# Altium schematic symbol library jlcpcb_2025_04_capacitors_extended_0603.schlib: 3668 symbols (part 11 of 20) (continued)
## CC0603MRX7R7BB104
designator C?  Capacitance: 100nF  (hidden comment: *)
Capacitor, Ceramic (MLCC), 100nF, ±20%, 16V, X7R, ±20%, SMD 0603; Manufacturer: YAGEO; Manufacturer Part Number: CC0603MRX7R7BB104; Package Size: 0603; JLCPCB Basic Part: No; JLCPCB Part Number: C2172848; Supplier 1: LCSC; Category: Capacitors - MLCC; Supplier Part Number 1: C2172848; Tolerance: ±20%; Voltage Rating: 16V; Temperature Coefficient: X7R; RoHS: Yes; ComponentLink1Description: Datasheet; ComponentLink1URL: https://wmsc.lcsc.com/wmsc/upload/file/pdf/v2/lcsc/2202040600_YAGEO-CC0603MRX7R7BB104_C2172848.pdf; ComponentLink2Description: JLCPCB Part URL; ComponentLink2URL: https://jlcpcb.com/partdetail/C2172848; ComponentLink3Description: LCSC Part URL; ComponentLink3URL: https://lcsc.com/product-detail/Multilayer-Ceramic-Capacitors-MLCC---SMD-SMT_YAGEO-YAGEO-CC0603MRX7R7BB104_C2172848.html
footprint CAP-0603 (0603 (1608M) Capacitor)
pins: 1, 2

## CC0603MRX7R8BB103
designator C?  Capacitance: 10nF  (hidden comment: *)
Capacitor, Ceramic (MLCC), 10nF, ±20%, 25V, X7R, ±20%, SMD 0603; Manufacturer: YAGEO; Manufacturer Part Number: CC0603MRX7R8BB103; Package Size: 0603; JLCPCB Basic Part: No; JLCPCB Part Number: C2181195; Supplier 1: LCSC; Category: Capacitors - MLCC; Supplier Part Number 1: C2181195; Tolerance: ±20%; Voltage Rating: 25V; Temperature Coefficient: X7R; RoHS: Yes; ComponentLink1Description: Datasheet; ComponentLink1URL: https://wmsc.lcsc.com/wmsc/upload/file/pdf/v2/lcsc/2202041200_YAGEO-CC0603MRX7R8BB103_C2181195.pdf; ComponentLink2Description: JLCPCB Part URL; ComponentLink2URL: https://jlcpcb.com/partdetail/C2181195; ComponentLink3Description: LCSC Part URL; ComponentLink3URL: https://lcsc.com/product-detail/Multilayer-Ceramic-Capacitors-MLCC---SMD-SMT_YAGEO-YAGEO-CC0603MRX7R8BB103_C2181195.html
footprint CAP-0603 (0603 (1608M) Capacitor)
pins: 1, 2

## CC0603MRX7R8BB104
designator C?  Capacitance: 100nF  (hidden comment: *)
Capacitor, Ceramic (MLCC), 100nF, ±20%, 25V, X7R, ±20%, SMD 0603; Manufacturer: YAGEO; Manufacturer Part Number: CC0603MRX7R8BB104; Package Size: 0603; JLCPCB Basic Part: No; JLCPCB Part Number: C2168700; Supplier 1: LCSC; Category: Capacitors - MLCC; Supplier Part Number 1: C2168700; Tolerance: ±20%; Voltage Rating: 25V; Temperature Coefficient: X7R; RoHS: Yes; ComponentLink1Description: Datasheet; ComponentLink1URL: https://wmsc.lcsc.com/wmsc/upload/file/pdf/v2/lcsc/2202040300_YAGEO-CC0603MRX7R8BB104_C2168700.pdf; ComponentLink2Description: JLCPCB Part URL; ComponentLink2URL: https://jlcpcb.com/partdetail/C2168700; ComponentLink3Description: LCSC Part URL; ComponentLink3URL: https://lcsc.com/product-detail/Multilayer-Ceramic-Capacitors-MLCC---SMD-SMT_YAGEO-YAGEO-CC0603MRX7R8BB104_C2168700.html
footprint CAP-0603 (0603 (1608M) Capacitor)
pins: 1, 2

## CC0603MRX7R8BB223
designator C?  Capacitance: 22nF  (hidden comment: *)
Capacitor, Ceramic (MLCC), 22nF, ±20%, 25V, X7R, ±20%, SMD 0603; Manufacturer: YAGEO; Manufacturer Part Number: CC0603MRX7R8BB223; Package Size: 0603; JLCPCB Basic Part: No; JLCPCB Part Number: C596326; Supplier 1: LCSC; Category: Capacitors - MLCC; Supplier Part Number 1: C596326; Tolerance: ±20%; Voltage Rating: 25V; Temperature Coefficient: X7R; RoHS: Yes; ComponentLink1Description: Datasheet; ComponentLink1URL: https://wmsc.lcsc.com/wmsc/upload/file/pdf/v2/lcsc/2006091816_YAGEO-CC0603MRX7R8BB223_C596326.pdf; ComponentLink2Description: JLCPCB Part URL; ComponentLink2URL: https://jlcpcb.com/partdetail/C596326; ComponentLink3Description: LCSC Part URL; ComponentLink3URL: https://lcsc.com/product-detail/Multilayer-Ceramic-Capacitors-MLCC---SMD-SMT_YAGEO-YAGEO-CC0603MRX7R8BB223_C596326.html
footprint CAP-0603 (0603 (1608M) Capacitor)
pins: 1, 2

## CC0603MRX7R9BB101
designator C?  Capacitance: 100pF  (hidden comment: *)
Capacitor, Ceramic (MLCC), 100pF, ±20%, 50V, X7R, ±20%, SMD 0603; Manufacturer: YAGEO; Manufacturer Part Number: CC0603MRX7R9BB101; Package Size: 0603; JLCPCB Basic Part: No; JLCPCB Part Number: C2185110; Supplier 1: LCSC; Category: Capacitors - MLCC; Supplier Part Number 1: C2185110; Tolerance: ±20%; Voltage Rating: 50V; Temperature Coefficient: X7R; RoHS: Yes; ComponentLink1Description: Datasheet; ComponentLink1URL: https://wmsc.lcsc.com/wmsc/upload/file/pdf/v2/lcsc/2202041500_YAGEO-CC0603MRX7R9BB101_C2185110.pdf; ComponentLink2Description: JLCPCB Part URL; ComponentLink2URL: https://jlcpcb.com/partdetail/C2185110; ComponentLink3Description: LCSC Part URL; ComponentLink3URL: https://lcsc.com/product-detail/Multilayer-Ceramic-Capacitors-MLCC---SMD-SMT_YAGEO-YAGEO-CC0603MRX7R9BB101_C2185110.html
footprint CAP-0603 (0603 (1608M) Capacitor)
pins: 1, 2

## CC0603MRX7R9BB103
designator C?  Capacitance: 10nF  (hidden comment: *)
Capacitor, Ceramic (MLCC), 10nF, ±20%, 50V, X7R, ±20%, SMD 0603; Manufacturer: YAGEO; Manufacturer Part Number: CC0603MRX7R9BB103; Package Size: 0603; JLCPCB Basic Part: No; JLCPCB Part Number: C726619; Supplier 1: LCSC; Category: Capacitors - MLCC; Supplier Part Number 1: C726619; Tolerance: ±20%; Voltage Rating: 50V; Temperature Coefficient: X7R; RoHS: Yes; ComponentLink1Description: Datasheet; ComponentLink1URL: https://wmsc.lcsc.com/wmsc/upload/file/pdf/v2/lcsc/2203311630_YAGEO-CC0603MRX7R9BB103_C726619.pdf; ComponentLink2Description: JLCPCB Part URL; ComponentLink2URL: https://jlcpcb.com/partdetail/C726619; ComponentLink3Description: LCSC Part URL; ComponentLink3URL: https://lcsc.com/product-detail/Multilayer-Ceramic-Capacitors-MLCC---SMD-SMT_YAGEO-YAGEO-CC0603MRX7R9BB103_C726619.html
footprint CAP-0603 (0603 (1608M) Capacitor)
pins: 1, 2

## CC0603MRX7R9BB104
designator C?  Capacitance: 100nF  (hidden comment: *)
Capacitor, Ceramic (MLCC), 100nF, ±20%, 50V, X7R, ±20%, SMD 0603; Manufacturer: YAGEO; Manufacturer Part Number: CC0603MRX7R9BB104; Package Size: 0603; JLCPCB Basic Part: No; JLCPCB Part Number: C2175984; Supplier 1: LCSC; Category: Capacitors - MLCC; Supplier Part Number 1: C2175984; Tolerance: ±20%; Voltage Rating: 50V; Temperature Coefficient: X7R; RoHS: Yes; ComponentLink1Description: Datasheet; ComponentLink1URL: https://wmsc.lcsc.com/wmsc/upload/file/pdf/v2/lcsc/2202040800_YAGEO-CC0603MRX7R9BB104_C2175984.pdf; ComponentLink2Description: JLCPCB Part URL; ComponentLink2URL: https://jlcpcb.com/partdetail/C2175984; ComponentLink3Description: LCSC Part URL; ComponentLink3URL: https://lcsc.com/product-detail/Multilayer-Ceramic-Capacitors-MLCC---SMD-SMT_YAGEO-YAGEO-CC0603MRX7R9BB104_C2175984.html
footprint CAP-0603 (0603 (1608M) Capacitor)
pins: 1, 2

## CC0603MRX7R9BB222
designator C?  Capacitance: 2.2nF  (hidden comment: *)
Capacitor, Ceramic (MLCC), 2.2nF, ±20%, 50V, X7R, ±20%, SMD 0603; Manufacturer: YAGEO; Manufacturer Part Number: CC0603MRX7R9BB222; Package Size: 0603; JLCPCB Basic Part: No; JLCPCB Part Number: C2185433; Supplier 1: LCSC; Category: Capacitors - MLCC; Supplier Part Number 1: C2185433; Tolerance: ±20%; Voltage Rating: 50V; Temperature Coefficient: X7R; RoHS: Yes; ComponentLink1Description: Datasheet; ComponentLink1URL: https://wmsc.lcsc.com/wmsc/upload/file/pdf/v2/lcsc/2202041500_YAGEO-CC0603MRX7R9BB222_C2185433.pdf; ComponentLink2Description: JLCPCB Part URL; ComponentLink2URL: https://jlcpcb.com/partdetail/C2185433; ComponentLink3Description: LCSC Part URL; ComponentLink3URL: https://lcsc.com/product-detail/Multilayer-Ceramic-Capacitors-MLCC---SMD-SMT_YAGEO-YAGEO-CC0603MRX7R9BB222_C2185433.html
footprint CAP-0603 (0603 (1608M) Capacitor)
pins: 1, 2

## CC0603MRX7R9BB223
designator C?  Capacitance: 22nF  (hidden comment: *)
Capacitor, Ceramic (MLCC), 22nF, ±20%, 50V, X7R, ±20%, SMD 0603; Manufacturer: YAGEO; Manufacturer Part Number: CC0603MRX7R9BB223; Package Size: 0603; JLCPCB Basic Part: No; JLCPCB Part Number: C1852881; Supplier 1: LCSC; Category: Capacitors - MLCC; Supplier Part Number 1: C1852881; Tolerance: ±20%; Voltage Rating: 50V; Temperature Coefficient: X7R; RoHS: Yes; ComponentLink1Description: Datasheet; ComponentLink1URL: https://wmsc.lcsc.com/wmsc/upload/file/pdf/v2/lcsc/2202081930_YAGEO-CC0603MRX7R9BB223_C1852881.pdf; ComponentLink2Description: JLCPCB Part URL; ComponentLink2URL: https://jlcpcb.com/partdetail/C1852881; ComponentLink3Description: LCSC Part URL; ComponentLink3URL: https://lcsc.com/product-detail/Multilayer-Ceramic-Capacitors-MLCC---SMD-SMT_YAGEO-YAGEO-CC0603MRX7R9BB223_C1852881.html
footprint CAP-0603 (0603 (1608M) Capacitor)
pins: 1, 2

## CC0603MRX7R9BB332
designator C?  Capacitance: 3.3nF  (hidden comment: *)
Capacitor, Ceramic (MLCC), 3.3nF, ±20%, 50V, X7R, ±20%, SMD 0603; Manufacturer: YAGEO; Manufacturer Part Number: CC0603MRX7R9BB332; Package Size: 0603; JLCPCB Basic Part: No; JLCPCB Part Number: C2180592; Supplier 1: LCSC; Category: Capacitors - MLCC; Supplier Part Number 1: C2180592; Tolerance: ±20%; Voltage Rating: 50V; Temperature Coefficient: X7R; RoHS: Yes; ComponentLink1Description: Datasheet; ComponentLink1URL: https://wmsc.lcsc.com/wmsc/upload/file/pdf/v2/lcsc/2202041130_YAGEO-CC0603MRX7R9BB332_C2180592.pdf; ComponentLink2Description: JLCPCB Part URL; ComponentLink2URL: https://jlcpcb.com/partdetail/C2180592; ComponentLink3Description: LCSC Part URL; ComponentLink3URL: https://lcsc.com/product-detail/Multilayer-Ceramic-Capacitors-MLCC---SMD-SMT_YAGEO-YAGEO-CC0603MRX7R9BB332_C2180592.html
footprint CAP-0603 (0603 (1608M) Capacitor)
pins: 1, 2

## CC0603MRX7R9BB471
designator C?  Capacitance: 470pF  (hidden comment: *)
Capacitor, Ceramic (MLCC), 470pF, ±20%, 50V, X7R, ±20%, SMD 0603; Manufacturer: YAGEO; Manufacturer Part Number: CC0603MRX7R9BB471; Package Size: 0603; JLCPCB Basic Part: No; JLCPCB Part Number: C2172850; Supplier 1: LCSC; Category: Capacitors - MLCC; Supplier Part Number 1: C2172850; Tolerance: ±20%; Voltage Rating: 50V; Temperature Coefficient: X7R; RoHS: Yes; ComponentLink1Description: Datasheet; ComponentLink1URL: https://wmsc.lcsc.com/wmsc/upload/file/pdf/v2/lcsc/2202040600_YAGEO-CC0603MRX7R9BB471_C2172850.pdf; ComponentLink2Description: JLCPCB Part URL; ComponentLink2URL: https://jlcpcb.com/partdetail/C2172850; ComponentLink3Description: LCSC Part URL; ComponentLink3URL: https://lcsc.com/product-detail/Multilayer-Ceramic-Capacitors-MLCC---SMD-SMT_YAGEO-YAGEO-CC0603MRX7R9BB471_C2172850.html
footprint CAP-0603 (0603 (1608M) Capacitor)
pins: 1, 2

## CC0603MRX7R9BB472
designator C?  Capacitance: 4.7nF  (hidden comment: *)
Capacitor, Ceramic (MLCC), 4.7nF, ±20%, 50V, X7R, ±20%, SMD 0603; Manufacturer: YAGEO; Manufacturer Part Number: CC0603MRX7R9BB472; Package Size: 0603; JLCPCB Basic Part: No; JLCPCB Part Number: C2180681; Supplier 1: LCSC; Category: Capacitors - MLCC; Supplier Part Number 1: C2180681; Tolerance: ±20%; Voltage Rating: 50V; Temperature Coefficient: X7R; RoHS: Yes; ComponentLink1Description: Datasheet; ComponentLink1URL: https://wmsc.lcsc.com/wmsc/upload/file/pdf/v2/lcsc/2202041130_YAGEO-CC0603MRX7R9BB472_C2180681.pdf; ComponentLink2Description: JLCPCB Part URL; ComponentLink2URL: https://jlcpcb.com/partdetail/C2180681; ComponentLink3Description: LCSC Part URL; ComponentLink3URL: https://lcsc.com/product-detail/Multilayer-Ceramic-Capacitors-MLCC---SMD-SMT_YAGEO-YAGEO-CC0603MRX7R9BB472_C2180681.html
footprint CAP-0603 (0603 (1608M) Capacitor)
pins: 1, 2

## CC0603MRX7R9BB682
designator C?  Capacitance: 6.8nF  (hidden comment: *)
Capacitor, Ceramic (MLCC), 6.8nF, ±20%, 50V, X7R, ±20%, SMD 0603; Manufacturer: YAGEO; Manufacturer Part Number: CC0603MRX7R9BB682; Package Size: 0603; JLCPCB Basic Part: No; JLCPCB Part Number: C1853064; Supplier 1: LCSC; Category: Capacitors - MLCC; Supplier Part Number 1: C1853064; Tolerance: ±20%; Voltage Rating: 50V; Temperature Coefficient: X7R; RoHS: Yes; ComponentLink1Description: Datasheet; ComponentLink1URL: https://wmsc.lcsc.com/wmsc/upload/file/pdf/v2/lcsc/2201271030_YAGEO-CC0603MRX7R9BB682_C1853064.pdf; ComponentLink2Description: JLCPCB Part URL; ComponentLink2URL: https://jlcpcb.com/partdetail/C1853064; ComponentLink3Description: LCSC Part URL; ComponentLink3URL: https://lcsc.com/product-detail/Multilayer-Ceramic-Capacitors-MLCC---SMD-SMT_YAGEO-YAGEO-CC0603MRX7R9BB682_C1853064.html
footprint CAP-0603 (0603 (1608M) Capacitor)
pins: 1, 2

## CC0603MRY5V6BB105
designator C?  Capacitance: 1uF  (hidden comment: *)
Capacitor, Ceramic (MLCC), 1uF, ±20%, 10V, Y5V, ±20%, SMD 0603; Manufacturer: YAGEO; Manufacturer Part Number: CC0603MRY5V6BB105; Package Size: 0603; JLCPCB Basic Part: No; JLCPCB Part Number: C519503; Supplier 1: LCSC; Category: Capacitors - MLCC; Supplier Part Number 1: C519503; Tolerance: ±20%; Voltage Rating: 10V; Temperature Coefficient: Y5V; RoHS: Yes; ComponentLink1Description: Datasheet; ComponentLink1URL: https://wmsc.lcsc.com/wmsc/upload/file/pdf/v2/lcsc/2006011835_YAGEO-CC0603MRY5V6BB105_C519503.pdf; ComponentLink2Description: JLCPCB Part URL; ComponentLink2URL: https://jlcpcb.com/partdetail/C519503; ComponentLink3Description: LCSC Part URL; ComponentLink3URL: https://lcsc.com/product-detail/Multilayer-Ceramic-Capacitors-MLCC---SMD-SMT_YAGEO-YAGEO-CC0603MRY5V6BB105_C519503.html
footprint CAP-0603 (0603 (1608M) Capacitor)
pins: 1, 2

## CC0603MRY5V6BB225
designator C?  Capacitance: 2.2uF  (hidden comment: *)
Capacitor, Ceramic (MLCC), 2.2uF, ±20%, 10V, Y5V, ±20%, SMD 0603; Manufacturer: YAGEO; Manufacturer Part Number: CC0603MRY5V6BB225; Package Size: 0603; JLCPCB Basic Part: No; JLCPCB Part Number: C519505; Supplier 1: LCSC; Category: Capacitors - MLCC; Supplier Part Number 1: C519505; Tolerance: ±20%; Voltage Rating: 10V; Temperature Coefficient: Y5V; RoHS: Yes; ComponentLink1Description: Datasheet; ComponentLink1URL: https://wmsc.lcsc.com/wmsc/upload/file/pdf/v2/lcsc/2010251434_YAGEO-CC0603MRY5V6BB225_C519505.pdf; ComponentLink2Description: JLCPCB Part URL; ComponentLink2URL: https://jlcpcb.com/partdetail/C519505; ComponentLink3Description: LCSC Part URL; ComponentLink3URL: https://lcsc.com/product-detail/Multilayer-Ceramic-Capacitors-MLCC---SMD-SMT_YAGEO-YAGEO-CC0603MRY5V6BB225_C519505.html
footprint CAP-0603 (0603 (1608M) Capacitor)
pins: 1, 2

## CC0603MRY5V7BB104
designator C?  Capacitance: 100nF  (hidden comment: *)
Capacitor, Ceramic (MLCC), 100nF, ±20%, 16V, Y5V, ±20%, SMD 0603; Manufacturer: YAGEO; Manufacturer Part Number: CC0603MRY5V7BB104; Package Size: 0603; JLCPCB Basic Part: No; JLCPCB Part Number: C519501; Supplier 1: LCSC; Category: Capacitors - MLCC; Supplier Part Number 1: C519501; Tolerance: ±20%; Voltage Rating: 16V; Temperature Coefficient: Y5V; RoHS: Yes; ComponentLink1Description: Datasheet; ComponentLink1URL: https://wmsc.lcsc.com/wmsc/upload/file/pdf/v2/lcsc/2210272130_YAGEO-CC0603MRY5V7BB104_C519501.pdf; ComponentLink2Description: JLCPCB Part URL; ComponentLink2URL: https://jlcpcb.com/partdetail/C519501; ComponentLink3Description: LCSC Part URL; ComponentLink3URL: https://lcsc.com/product-detail/Multilayer-Ceramic-Capacitors-MLCC---SMD-SMT_YAGEO-YAGEO-CC0603MRY5V7BB104_C519501.html
footprint CAP-0603 (0603 (1608M) Capacitor)
pins: 1, 2

## CC0603MRY5V7BB105
designator C?  Capacitance: 1uF  (hidden comment: *)
Capacitor, Ceramic (MLCC), 1uF, ±20%, 16V, Y5V, ±20%, SMD 0603; Manufacturer: YAGEO; Manufacturer Part Number: CC0603MRY5V7BB105; Package Size: 0603; JLCPCB Basic Part: No; JLCPCB Part Number: C519504; Supplier 1: LCSC; Category: Capacitors - MLCC; Supplier Part Number 1: C519504; Tolerance: ±20%; Voltage Rating: 16V; Temperature Coefficient: Y5V; RoHS: Yes; ComponentLink1Description: Datasheet; ComponentLink1URL: https://wmsc.lcsc.com/wmsc/upload/file/pdf/v2/lcsc/2005181835_YAGEO-CC0603MRY5V7BB105_C519504.pdf; ComponentLink2Description: JLCPCB Part URL; ComponentLink2URL: https://jlcpcb.com/partdetail/C519504; ComponentLink3Description: LCSC Part URL; ComponentLink3URL: https://lcsc.com/product-detail/Multilayer-Ceramic-Capacitors-MLCC---SMD-SMT_YAGEO-YAGEO-CC0603MRY5V7BB105_C519504.html
footprint CAP-0603 (0603 (1608M) Capacitor)
pins: 1, 2

## CC0603MRY5V7BB225
designator C?  Capacitance: 2.2uF  (hidden comment: *)
Capacitor, Ceramic (MLCC), 2.2uF, ±20%, 16V, Y5V, ±20%, SMD 0603; Manufacturer: YAGEO; Manufacturer Part Number: CC0603MRY5V7BB225; Package Size: 0603; JLCPCB Basic Part: No; JLCPCB Part Number: C519506; Supplier 1: LCSC; Category: Capacitors - MLCC; Supplier Part Number 1: C519506; Tolerance: ±20%; Voltage Rating: 16V; Temperature Coefficient: Y5V; RoHS: Yes; ComponentLink1Description: Datasheet; ComponentLink1URL: https://wmsc.lcsc.com/wmsc/upload/file/pdf/v2/lcsc/2006011835_YAGEO-CC0603MRY5V7BB225_C519506.pdf; ComponentLink2Description: JLCPCB Part URL; ComponentLink2URL: https://jlcpcb.com/partdetail/C519506; ComponentLink3Description: LCSC Part URL; ComponentLink3URL: https://lcsc.com/product-detail/Multilayer-Ceramic-Capacitors-MLCC---SMD-SMT_YAGEO-YAGEO-CC0603MRY5V7BB225_C519506.html
footprint CAP-0603 (0603 (1608M) Capacitor)
pins: 1, 2

## CC0603MRY5V7BB474
designator C?  Capacitance: 470nF  (hidden comment: *)
Capacitor, Ceramic (MLCC), 470nF, ±20%, 16V, Y5V, ±20%, SMD 0603; Manufacturer: YAGEO; Manufacturer Part Number: CC0603MRY5V7BB474; Package Size: 0603; JLCPCB Basic Part: No; JLCPCB Part Number: C726620; Supplier 1: LCSC; Category: Capacitors - MLCC; Supplier Part Number 1: C726620; Tolerance: ±20%; Voltage Rating: 16V; Temperature Coefficient: Y5V; RoHS: Yes; ComponentLink1Description: Datasheet; ComponentLink1URL: https://wmsc.lcsc.com/wmsc/upload/file/pdf/v2/lcsc/2304140030_YAGEO-CC0603MRY5V7BB474_C726620.pdf; ComponentLink2Description: JLCPCB Part URL; ComponentLink2URL: https://jlcpcb.com/partdetail/C726620; ComponentLink3Description: LCSC Part URL; ComponentLink3URL: https://lcsc.com/product-detail/Multilayer-Ceramic-Capacitors-MLCC---SMD-SMT_YAGEO-YAGEO-CC0603MRY5V7BB474_C726620.html
footprint CAP-0603 (0603 (1608M) Capacitor)
pins: 1, 2

## CC0603MRY5V8BB104
designator C?  Capacitance: 100nF  (hidden comment: *)
Capacitor, Ceramic (MLCC), 100nF, ±20%, 25V, Y5V, ±20%, SMD 0603; Manufacturer: YAGEO; Manufacturer Part Number: CC0603MRY5V8BB104; Package Size: 0603; JLCPCB Basic Part: No; JLCPCB Part Number: C519502; Supplier 1: LCSC; Category: Capacitors - MLCC; Supplier Part Number 1: C519502; Tolerance: ±20%; Voltage Rating: 25V; Temperature Coefficient: Y5V; RoHS: Yes; ComponentLink1Description: Datasheet; ComponentLink1URL: https://wmsc.lcsc.com/wmsc/upload/file/pdf/v2/lcsc/2205182016_YAGEO-CC0603MRY5V8BB104_C519502.pdf; ComponentLink2Description: JLCPCB Part URL; ComponentLink2URL: https://jlcpcb.com/partdetail/C519502; ComponentLink3Description: LCSC Part URL; ComponentLink3URL: https://lcsc.com/product-detail/Multilayer-Ceramic-Capacitors-MLCC---SMD-SMT_YAGEO-YAGEO-CC0603MRY5V8BB104_C519502.html
footprint CAP-0603 (0603 (1608M) Capacitor)
pins: 1, 2

## CC0603MRY5V9BB104
designator C?  Capacitance: 100nF  (hidden comment: *)
Capacitor, Ceramic (MLCC), 100nF, ±20%, 50V, Y5V, ±20%, SMD 0603; Manufacturer: YAGEO; Manufacturer Part Number: CC0603MRY5V9BB104; Package Size: 0603; JLCPCB Basic Part: No; JLCPCB Part Number: C91184; Supplier 1: LCSC; Category: Capacitors - MLCC; Supplier Part Number 1: C91184; Tolerance: ±20%; Voltage Rating: 50V; Temperature Coefficient: Y5V; RoHS: Yes; ComponentLink1Description: Datasheet; ComponentLink1URL: https://wmsc.lcsc.com/wmsc/upload/file/pdf/v2/lcsc/2304140030_YAGEO-CC0603MRY5V9BB104_C91184.pdf; ComponentLink2Description: JLCPCB Part URL; ComponentLink2URL: https://jlcpcb.com/partdetail/C91184; ComponentLink3Description: LCSC Part URL; ComponentLink3URL: https://lcsc.com/product-detail/Multilayer-Ceramic-Capacitors-MLCC---SMD-SMT_YAGEO-YAGEO-CC0603MRY5V9BB104_C91184.html
footprint CAP-0603 (0603 (1608M) Capacitor)
pins: 1, 2

## CC0603ZRY5V5BB225
designator C?  Capacitance: 2.2uF  (hidden comment: *)
Capacitor, Ceramic (MLCC), 2.2uF, 6.3V, Y5V, SMD 0603; Manufacturer: YAGEO; Manufacturer Part Number: CC0603ZRY5V5BB225; Temperature Rating: -20%~+80%; Package Size: 0603; JLCPCB Basic Part: No; JLCPCB Part Number: C519448; Supplier 1: LCSC; Category: Capacitors - MLCC; Supplier Part Number 1: C519448; Voltage Rating: 6.3V; Temperature Coefficient: Y5V; RoHS: Yes; ComponentLink1Description: Datasheet; ComponentLink1URL: https://wmsc.lcsc.com/wmsc/upload/file/pdf/v2/lcsc/2304140030_YAGEO-CC0603ZRY5V5BB225_C519448.pdf; ComponentLink2Description: JLCPCB Part URL; ComponentLink2URL: https://jlcpcb.com/partdetail/C519448; ComponentLink3Description: LCSC Part URL; ComponentLink3URL: https://lcsc.com/product-detail/Multilayer-Ceramic-Capacitors-MLCC---SMD-SMT_YAGEO-YAGEO-CC0603ZRY5V5BB225_C519448.html
footprint CAP-0603 (0603 (1608M) Capacitor)
pins: 1, 2

## CC0603ZRY5V5BB475
designator C?  Capacitance: 4.7uF  (hidden comment: *)
Capacitor, Ceramic (MLCC), 4.7uF, 6.3V, Y5V, SMD 0603; Manufacturer: YAGEO; Manufacturer Part Number: CC0603ZRY5V5BB475; Temperature Rating: -20%~+80%; Package Size: 0603; JLCPCB Basic Part: No; JLCPCB Part Number: C326060; Supplier 1: LCSC; Category: Capacitors - MLCC; Supplier Part Number 1: C326060; Voltage Rating: 6.3V; Temperature Coefficient: Y5V; RoHS: Yes; ComponentLink1Description: Datasheet; ComponentLink1URL: https://wmsc.lcsc.com/wmsc/upload/file/pdf/v2/lcsc/1811142132_YAGEO-CC0603ZRY5V5BB475_C326060.pdf; ComponentLink2Description: JLCPCB Part URL; ComponentLink2URL: https://jlcpcb.com/partdetail/C326060; ComponentLink3Description: LCSC Part URL; ComponentLink3URL: https://lcsc.com/product-detail/Multilayer-Ceramic-Capacitors-MLCC---SMD-SMT_YAGEO-YAGEO-CC0603ZRY5V5BB475_C326060.html
footprint CAP-0603 (0603 (1608M) Capacitor)
pins: 1, 2

## CC0603ZRY5V6BB105
designator C?  Capacitance: 1uF  (hidden comment: *)
Capacitor, Ceramic (MLCC), 1uF, 10V, Y5V, SMD 0603; Manufacturer: YAGEO; Manufacturer Part Number: CC0603ZRY5V6BB105; Temperature Rating: -20%~+80%; Package Size: 0603; JLCPCB Basic Part: No; JLCPCB Part Number: C106220; Supplier 1: LCSC; Category: Capacitors - MLCC; Supplier Part Number 1: C106220; Voltage Rating: 10V; Temperature Coefficient: Y5V; RoHS: Yes; ComponentLink1Description: Datasheet; ComponentLink1URL: https://wmsc.lcsc.com/wmsc/upload/file/pdf/v2/lcsc/2304140030_YAGEO-CC0603ZRY5V6BB105_C106220.pdf; ComponentLink2Description: JLCPCB Part URL; ComponentLink2URL: https://jlcpcb.com/partdetail/C106220; ComponentLink3Description: LCSC Part URL; ComponentLink3URL: https://lcsc.com/product-detail/Multilayer-Ceramic-Capacitors-MLCC---SMD-SMT_YAGEO-YAGEO-CC0603ZRY5V6BB105_C106220.html
footprint CAP-0603 (0603 (1608M) Capacitor)
pins: 1, 2

## CC0603ZRY5V6BB225
designator C?  Capacitance: 2.2uF  (hidden comment: *)
Capacitor, Ceramic (MLCC), 2.2uF, 10V, Y5V, SMD 0603; Manufacturer: YAGEO; Manufacturer Part Number: CC0603ZRY5V6BB225; Temperature Rating: -20%~+80%; Package Size: 0603; JLCPCB Basic Part: No; JLCPCB Part Number: C106849; Supplier 1: LCSC; Category: Capacitors - MLCC; Supplier Part Number 1: C106849; Voltage Rating: 10V; Temperature Coefficient: Y5V; RoHS: Yes; ComponentLink1Description: Datasheet; ComponentLink1URL: https://wmsc.lcsc.com/wmsc/upload/file/pdf/v2/lcsc/2304140030_YAGEO-CC0603ZRY5V6BB225_C106849.pdf; ComponentLink2Description: JLCPCB Part URL; ComponentLink2URL: https://jlcpcb.com/partdetail/C106849; ComponentLink3Description: LCSC Part URL; ComponentLink3URL: https://lcsc.com/product-detail/Multilayer-Ceramic-Capacitors-MLCC---SMD-SMT_YAGEO-YAGEO-CC0603ZRY5V6BB225_C106849.html
footprint CAP-0603 (0603 (1608M) Capacitor)
pins: 1, 2

## CC0603ZRY5V6BB474
designator C?  Capacitance: 470nF  (hidden comment: *)
Capacitor, Ceramic (MLCC), 470nF, 10V, Y5V, SMD 0603; Manufacturer: YAGEO; Manufacturer Part Number: CC0603ZRY5V6BB474; Temperature Rating: -20%~+80%; Package Size: 0603; JLCPCB Basic Part: No; JLCPCB Part Number: C327269; Supplier 1: LCSC; Category: Capacitors - MLCC; Supplier Part Number 1: C327269; Voltage Rating: 10V; Temperature Coefficient: Y5V; RoHS: Yes; ComponentLink1Description: Datasheet; ComponentLink1URL: https://wmsc.lcsc.com/wmsc/upload/file/pdf/v2/lcsc/2311211121_YAGEO-CC0603ZRY5V6BB474_C327269.pdf; ComponentLink2Description: JLCPCB Part URL; ComponentLink2URL: https://jlcpcb.com/partdetail/C327269; ComponentLink3Description: LCSC Part URL; ComponentLink3URL: https://lcsc.com/product-detail/Multilayer-Ceramic-Capacitors-MLCC---SMD-SMT_YAGEO-YAGEO-CC0603ZRY5V6BB474_C327269.html
footprint CAP-0603 (0603 (1608M) Capacitor)
pins: 1, 2

## CC0603ZRY5V6BB475
designator C?  Capacitance: 4.7uF  (hidden comment: *)
Capacitor, Ceramic (MLCC), 4.7uF, 10V, Y5V, SMD 0603; Manufacturer: YAGEO; Manufacturer Part Number: CC0603ZRY5V6BB475; Temperature Rating: -20%~+80%; Package Size: 0603; JLCPCB Basic Part: No; JLCPCB Part Number: C576864; Supplier 1: LCSC; Category: Capacitors - MLCC; Supplier Part Number 1: C576864; Voltage Rating: 10V; Temperature Coefficient: Y5V; RoHS: Yes; ComponentLink1Description: Datasheet; ComponentLink1URL: https://wmsc.lcsc.com/wmsc/upload/file/pdf/v2/lcsc/2304140030_YAGEO-CC0603ZRY5V6BB475_C576864.pdf; ComponentLink2Description: JLCPCB Part URL; ComponentLink2URL: https://jlcpcb.com/partdetail/C576864; ComponentLink3Description: LCSC Part URL; ComponentLink3URL: https://lcsc.com/product-detail/Multilayer-Ceramic-Capacitors-MLCC---SMD-SMT_YAGEO-YAGEO-CC0603ZRY5V6BB475_C576864.html
footprint CAP-0603 (0603 (1608M) Capacitor)
pins: 1, 2

## CC0603ZRY5V7BB104
designator C?  Capacitance: 100nF  (hidden comment: *)
Capacitor, Ceramic (MLCC), 100nF, 16V, Y5V, SMD 0603; Manufacturer: YAGEO; Manufacturer Part Number: CC0603ZRY5V7BB104; Temperature Rating: -20%~+80%; Package Size: 0603; JLCPCB Basic Part: No; JLCPCB Part Number: C519445; Supplier 1: LCSC; Category: Capacitors - MLCC; Supplier Part Number 1: C519445; Voltage Rating: 16V; Temperature Coefficient: Y5V; RoHS: Yes; ComponentLink1Description: Datasheet; ComponentLink1URL: https://wmsc.lcsc.com/wmsc/upload/file/pdf/v2/lcsc/2204291445_YAGEO-CC0603ZRY5V7BB104_C519445.pdf; ComponentLink2Description: JLCPCB Part URL; ComponentLink2URL: https://jlcpcb.com/partdetail/C519445; ComponentLink3Description: LCSC Part URL; ComponentLink3URL: https://lcsc.com/product-detail/Multilayer-Ceramic-Capacitors-MLCC---SMD-SMT_YAGEO-YAGEO-CC0603ZRY5V7BB104_C519445.html
footprint CAP-0603 (0603 (1608M) Capacitor)
pins: 1, 2

## CC0603ZRY5V7BB105
designator C?  Capacitance: 1uF  (hidden comment: *)
Capacitor, Ceramic (MLCC), 1uF, 16V, Y5V, SMD 0603; Manufacturer: YAGEO; Manufacturer Part Number: CC0603ZRY5V7BB105; Temperature Rating: -20%~+80%; Package Size: 0603; JLCPCB Basic Part: No; JLCPCB Part Number: C106219; Supplier 1: LCSC; Category: Capacitors - MLCC; Supplier Part Number 1: C106219; Voltage Rating: 16V; Temperature Coefficient: Y5V; RoHS: Yes; ComponentLink1Description: Datasheet; ComponentLink1URL: https://wmsc.lcsc.com/wmsc/upload/file/pdf/v2/lcsc/2304140030_YAGEO-CC0603ZRY5V7BB105_C106219.pdf; ComponentLink2Description: JLCPCB Part URL; ComponentLink2URL: https://jlcpcb.com/partdetail/C106219; ComponentLink3Description: LCSC Part URL; ComponentLink3URL: https://lcsc.com/product-detail/Multilayer-Ceramic-Capacitors-MLCC---SMD-SMT_YAGEO-YAGEO-CC0603ZRY5V7BB105_C106219.html
footprint CAP-0603 (0603 (1608M) Capacitor)
pins: 1, 2

## CC0603ZRY5V7BB224
designator C?  Capacitance: 220nF  (hidden comment: *)
Capacitor, Ceramic (MLCC), 220nF, 16V, Y5V, SMD 0603; Manufacturer: YAGEO; Manufacturer Part Number: CC0603ZRY5V7BB224; Temperature Rating: -20%~+80%; Package Size: 0603; JLCPCB Basic Part: No; JLCPCB Part Number: C113813; Supplier 1: LCSC; Category: Capacitors - MLCC; Supplier Part Number 1: C113813; Voltage Rating: 16V; Temperature Coefficient: Y5V; RoHS: Yes; ComponentLink1Description: Datasheet; ComponentLink1URL: https://wmsc.lcsc.com/wmsc/upload/file/pdf/v2/lcsc/2304140030_YAGEO-CC0603ZRY5V7BB224_C113813.pdf; ComponentLink2Description: JLCPCB Part URL; ComponentLink2URL: https://jlcpcb.com/partdetail/C113813; ComponentLink3Description: LCSC Part URL; ComponentLink3URL: https://lcsc.com/product-detail/Multilayer-Ceramic-Capacitors-MLCC---SMD-SMT_YAGEO-YAGEO-CC0603ZRY5V7BB224_C113813.html
footprint CAP-0603 (0603 (1608M) Capacitor)
pins: 1, 2

## CC0603ZRY5V7BB225
designator C?  Capacitance: 2.2uF  (hidden comment: *)
Capacitor, Ceramic (MLCC), 2.2uF, 16V, Y5V, SMD 0603; Manufacturer: YAGEO; Manufacturer Part Number: CC0603ZRY5V7BB225; Temperature Rating: -20%~+80%; Package Size: 0603; JLCPCB Basic Part: No; JLCPCB Part Number: C106832; Supplier 1: LCSC; Category: Capacitors - MLCC; Supplier Part Number 1: C106832; Voltage Rating: 16V; Temperature Coefficient: Y5V; RoHS: Yes; ComponentLink1Description: Datasheet; ComponentLink1URL: https://wmsc.lcsc.com/wmsc/upload/file/pdf/v2/lcsc/2304140030_YAGEO-CC0603ZRY5V7BB225_C106832.pdf; ComponentLink2Description: JLCPCB Part URL; ComponentLink2URL: https://jlcpcb.com/partdetail/C106832; ComponentLink3Description: LCSC Part URL; ComponentLink3URL: https://lcsc.com/product-detail/Multilayer-Ceramic-Capacitors-MLCC---SMD-SMT_YAGEO-YAGEO-CC0603ZRY5V7BB225_C106832.html
footprint CAP-0603 (0603 (1608M) Capacitor)
pins: 1, 2

## CC0603ZRY5V7BB334
designator C?  Capacitance: 330nF  (hidden comment: *)
Capacitor, Ceramic (MLCC), 330nF, 16V, Y5V, SMD 0603; Manufacturer: YAGEO; Manufacturer Part Number: CC0603ZRY5V7BB334; Temperature Rating: -20%~+80%; Package Size: 0603; JLCPCB Basic Part: No; JLCPCB Part Number: C327128; Supplier 1: LCSC; Category: Capacitors - MLCC; Supplier Part Number 1: C327128; Voltage Rating: 16V; Temperature Coefficient: Y5V; RoHS: Yes; ComponentLink1Description: Datasheet; ComponentLink1URL: https://wmsc.lcsc.com/wmsc/upload/file/pdf/v2/lcsc/1811141240_YAGEO-CC0603ZRY5V7BB334_C327128.pdf; ComponentLink2Description: JLCPCB Part URL; ComponentLink2URL: https://jlcpcb.com/partdetail/C327128; ComponentLink3Description: LCSC Part URL; ComponentLink3URL: https://lcsc.com/product-detail/Multilayer-Ceramic-Capacitors-MLCC---SMD-SMT_YAGEO-YAGEO-CC0603ZRY5V7BB334_C327128.html
footprint CAP-0603 (0603 (1608M) Capacitor)
pins: 1, 2

## CC0603ZRY5V7BB474
designator C?  Capacitance: 470nF  (hidden comment: *)
Capacitor, Ceramic (MLCC), 470nF, 16V, Y5V, SMD 0603; Manufacturer: YAGEO; Manufacturer Part Number: CC0603ZRY5V7BB474; Temperature Rating: -20%~+80%; Package Size: 0603; JLCPCB Basic Part: No; JLCPCB Part Number: C106852; Supplier 1: LCSC; Category: Capacitors - MLCC; Supplier Part Number 1: C106852; Voltage Rating: 16V; Temperature Coefficient: Y5V; RoHS: Yes; ComponentLink1Description: Datasheet; ComponentLink1URL: https://wmsc.lcsc.com/wmsc/upload/file/pdf/v2/lcsc/2007151105_YAGEO-CC0603ZRY5V7BB474_C106852.pdf; ComponentLink2Description: JLCPCB Part URL; ComponentLink2URL: https://jlcpcb.com/partdetail/C106852; ComponentLink3Description: LCSC Part URL; ComponentLink3URL: https://lcsc.com/product-detail/Multilayer-Ceramic-Capacitors-MLCC---SMD-SMT_YAGEO-YAGEO-CC0603ZRY5V7BB474_C106852.html
footprint CAP-0603 (0603 (1608M) Capacitor)
pins: 1, 2

## CC0603ZRY5V8BB103
designator C?  Capacitance: 10nF  (hidden comment: *)
Capacitor, Ceramic (MLCC), 10nF, 25V, Y5V, SMD 0603; Manufacturer: YAGEO; Manufacturer Part Number: CC0603ZRY5V8BB103; Temperature Rating: -20%~+80%; Package Size: 0603; JLCPCB Basic Part: No; JLCPCB Part Number: C576872; Supplier 1: LCSC; Category: Capacitors - MLCC; Supplier Part Number 1: C576872; Voltage Rating: 25V; Temperature Coefficient: Y5V; RoHS: Yes; ComponentLink1Description: Datasheet; ComponentLink1URL: https://wmsc.lcsc.com/wmsc/upload/file/pdf/v2/lcsc/2012141237_YAGEO-CC0603ZRY5V8BB103_C576872.pdf; ComponentLink2Description: JLCPCB Part URL; ComponentLink2URL: https://jlcpcb.com/partdetail/C576872; ComponentLink3Description: LCSC Part URL; ComponentLink3URL: https://lcsc.com/product-detail/Multilayer-Ceramic-Capacitors-MLCC---SMD-SMT_YAGEO-YAGEO-CC0603ZRY5V8BB103_C576872.html
footprint CAP-0603 (0603 (1608M) Capacitor)
pins: 1, 2

## CC0603ZRY5V8BB104
designator C?  Capacitance: 100nF  (hidden comment: *)
Capacitor, Ceramic (MLCC), 100nF, 25V, Y5V, SMD 0603; Manufacturer: YAGEO; Manufacturer Part Number: CC0603ZRY5V8BB104; Temperature Rating: -20%~+80%; Package Size: 0603; JLCPCB Basic Part: No; JLCPCB Part Number: C389102; Supplier 1: LCSC; Category: Capacitors - MLCC; Supplier Part Number 1: C389102; Voltage Rating: 25V; Temperature Coefficient: Y5V; RoHS: Yes; ComponentLink1Description: Datasheet; ComponentLink1URL: https://wmsc.lcsc.com/wmsc/upload/file/pdf/v2/lcsc/1912111437_YAGEO-CC0603ZRY5V8BB104_C389102.pdf; ComponentLink2Description: JLCPCB Part URL; ComponentLink2URL: https://jlcpcb.com/partdetail/C389102; ComponentLink3Description: LCSC Part URL; ComponentLink3URL: https://lcsc.com/product-detail/Multilayer-Ceramic-Capacitors-MLCC---SMD-SMT_YAGEO-YAGEO-CC0603ZRY5V8BB104_C389102.html
footprint CAP-0603 (0603 (1608M) Capacitor)
pins: 1, 2

## CC0603ZRY5V8BB105
designator C?  Capacitance: 1uF  (hidden comment: *)
Capacitor, Ceramic (MLCC), 1uF, 25V, Y5V, SMD 0603; Manufacturer: YAGEO; Manufacturer Part Number: CC0603ZRY5V8BB105; Temperature Rating: -20%~+80%; Package Size: 0603; JLCPCB Basic Part: No; JLCPCB Part Number: C106848; Supplier 1: LCSC; Category: Capacitors - MLCC; Supplier Part Number 1: C106848; Voltage Rating: 25V; Temperature Coefficient: Y5V; RoHS: Yes; ComponentLink1Description: Datasheet; ComponentLink1URL: https://wmsc.lcsc.com/wmsc/upload/file/pdf/v2/lcsc/2304140030_YAGEO-CC0603ZRY5V8BB105_C106848.pdf; ComponentLink2Description: JLCPCB Part URL; ComponentLink2URL: https://jlcpcb.com/partdetail/C106848; ComponentLink3Description: LCSC Part URL; ComponentLink3URL: https://lcsc.com/product-detail/Multilayer-Ceramic-Capacitors-MLCC---SMD-SMT_YAGEO-YAGEO-CC0603ZRY5V8BB105_C106848.html
footprint CAP-0603 (0603 (1608M) Capacitor)
pins: 1, 2

## CC0603ZRY5V8BB224
designator C?  Capacitance: 220nF  (hidden comment: *)
Capacitor, Ceramic (MLCC), 220nF, 25V, Y5V, SMD 0603; Manufacturer: YAGEO; Manufacturer Part Number: CC0603ZRY5V8BB224; Temperature Rating: -20%~+80%; Package Size: 0603; JLCPCB Basic Part: No; JLCPCB Part Number: C113814; Supplier 1: LCSC; Category: Capacitors - MLCC; Supplier Part Number 1: C113814; Voltage Rating: 25V; Temperature Coefficient: Y5V; RoHS: Yes; ComponentLink1Description: Datasheet; ComponentLink1URL: https://wmsc.lcsc.com/wmsc/upload/file/pdf/v2/lcsc/2304140030_YAGEO-CC0603ZRY5V8BB224_C113814.pdf; ComponentLink2Description: JLCPCB Part URL; ComponentLink2URL: https://jlcpcb.com/partdetail/C113814; ComponentLink3Description: LCSC Part URL; ComponentLink3URL: https://lcsc.com/product-detail/Multilayer-Ceramic-Capacitors-MLCC---SMD-SMT_YAGEO-YAGEO-CC0603ZRY5V8BB224_C113814.html
footprint CAP-0603 (0603 (1608M) Capacitor)
pins: 1, 2

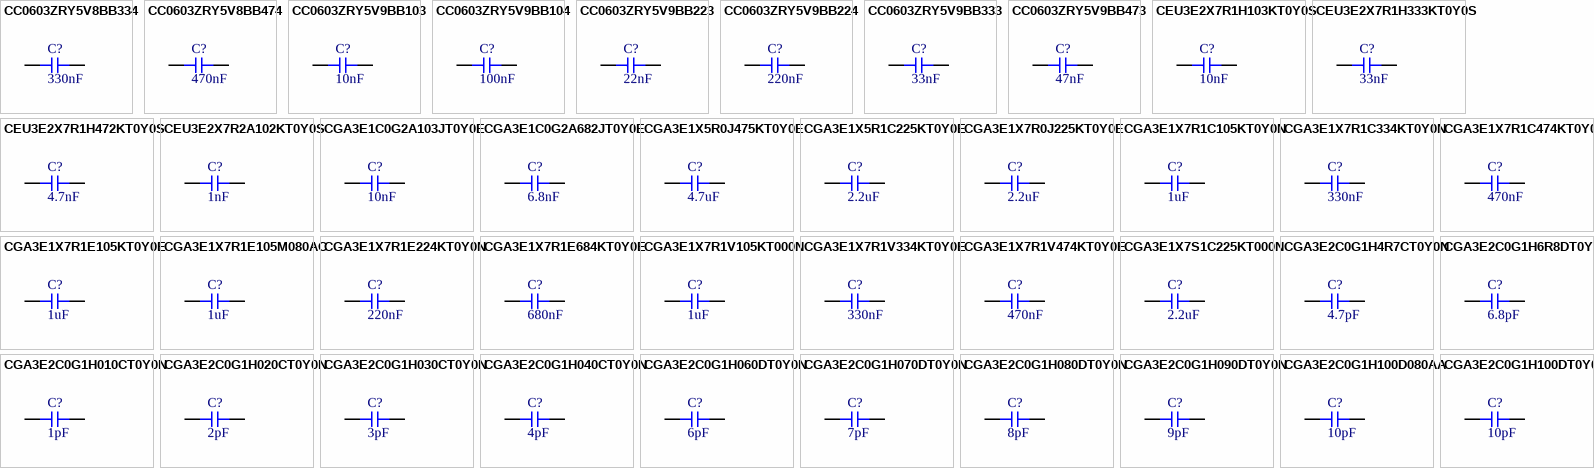
[diagram p51: symbols CC0603ZRY5V8BB334 to CGA3E2C0G1H100DT0Y0N]

## CC0603ZRY5V8BB334
designator C?  Capacitance: 330nF  (hidden comment: *)
Capacitor, Ceramic (MLCC), 330nF, 25V, Y5V, SMD 0603; Manufacturer: YAGEO; Manufacturer Part Number: CC0603ZRY5V8BB334; Temperature Rating: -20%~+80%; Package Size: 0603; JLCPCB Basic Part: No; JLCPCB Part Number: C107102; Supplier 1: LCSC; Category: Capacitors - MLCC; Supplier Part Number 1: C107102; Voltage Rating: 25V; Temperature Coefficient: Y5V; RoHS: Yes; ComponentLink1Description: Datasheet; ComponentLink1URL: https://wmsc.lcsc.com/wmsc/upload/file/pdf/v2/lcsc/2304140030_YAGEO-CC0603ZRY5V8BB334_C107102.pdf; ComponentLink2Description: JLCPCB Part URL; ComponentLink2URL: https://jlcpcb.com/partdetail/C107102; ComponentLink3Description: LCSC Part URL; ComponentLink3URL: https://lcsc.com/product-detail/Multilayer-Ceramic-Capacitors-MLCC---SMD-SMT_YAGEO-YAGEO-CC0603ZRY5V8BB334_C107102.html
footprint CAP-0603 (0603 (1608M) Capacitor)
pins: 1, 2

## CC0603ZRY5V8BB474
designator C?  Capacitance: 470nF  (hidden comment: *)
Capacitor, Ceramic (MLCC), 470nF, 25V, Y5V, SMD 0603; Manufacturer: YAGEO; Manufacturer Part Number: CC0603ZRY5V8BB474; Temperature Rating: -20%~+80%; Package Size: 0603; JLCPCB Basic Part: No; JLCPCB Part Number: C326968; Supplier 1: LCSC; Category: Capacitors - MLCC; Supplier Part Number 1: C326968; Voltage Rating: 25V; Temperature Coefficient: Y5V; RoHS: Yes; ComponentLink1Description: Datasheet; ComponentLink1URL: https://wmsc.lcsc.com/wmsc/upload/file/pdf/v2/lcsc/1811141233_YAGEO-CC0603ZRY5V8BB474_C326968.pdf; ComponentLink2Description: JLCPCB Part URL; ComponentLink2URL: https://jlcpcb.com/partdetail/C326968; ComponentLink3Description: LCSC Part URL; ComponentLink3URL: https://lcsc.com/product-detail/Multilayer-Ceramic-Capacitors-MLCC---SMD-SMT_YAGEO-YAGEO-CC0603ZRY5V8BB474_C326968.html
footprint CAP-0603 (0603 (1608M) Capacitor)
pins: 1, 2

## CC0603ZRY5V9BB103
designator C?  Capacitance: 10nF  (hidden comment: *)
Capacitor, Ceramic (MLCC), 10nF, 50V, Y5V, SMD 0603; Manufacturer: YAGEO; Manufacturer Part Number: CC0603ZRY5V9BB103; Temperature Rating: -20%~+80%; Package Size: 0603; JLCPCB Basic Part: No; JLCPCB Part Number: C576877; Supplier 1: LCSC; Category: Capacitors - MLCC; Supplier Part Number 1: C576877; Voltage Rating: 50V; Temperature Coefficient: Y5V; RoHS: Yes; ComponentLink1Description: Datasheet; ComponentLink1URL: https://wmsc.lcsc.com/wmsc/upload/file/pdf/v2/lcsc/2011102005_YAGEO-CC0603ZRY5V9BB103_C576877.pdf; ComponentLink2Description: JLCPCB Part URL; ComponentLink2URL: https://jlcpcb.com/partdetail/C576877; ComponentLink3Description: LCSC Part URL; ComponentLink3URL: https://lcsc.com/product-detail/Multilayer-Ceramic-Capacitors-MLCC---SMD-SMT_YAGEO-YAGEO-CC0603ZRY5V9BB103_C576877.html
footprint CAP-0603 (0603 (1608M) Capacitor)
pins: 1, 2

## CC0603ZRY5V9BB104
designator C?  Capacitance: 100nF  (hidden comment: *)
Capacitor, Ceramic (MLCC), 100nF, 50V, Y5V, SMD 0603; Manufacturer: YAGEO; Manufacturer Part Number: CC0603ZRY5V9BB104; Temperature Rating: -20%~+80%; Package Size: 0603; JLCPCB Basic Part: No; JLCPCB Part Number: C106221; Supplier 1: LCSC; Category: Capacitors - MLCC; Supplier Part Number 1: C106221; Voltage Rating: 50V; Temperature Coefficient: Y5V; RoHS: Yes; ComponentLink1Description: Datasheet; ComponentLink1URL: https://wmsc.lcsc.com/wmsc/upload/file/pdf/v2/lcsc/2304140030_YAGEO-CC0603ZRY5V9BB104_C106221.pdf; ComponentLink2Description: JLCPCB Part URL; ComponentLink2URL: https://jlcpcb.com/partdetail/C106221; ComponentLink3Description: LCSC Part URL; ComponentLink3URL: https://lcsc.com/product-detail/Multilayer-Ceramic-Capacitors-MLCC---SMD-SMT_YAGEO-YAGEO-CC0603ZRY5V9BB104_C106221.html
footprint CAP-0603 (0603 (1608M) Capacitor)
pins: 1, 2

## CC0603ZRY5V9BB223
designator C?  Capacitance: 22nF  (hidden comment: *)
Capacitor, Ceramic (MLCC), 22nF, 50V, Y5V, SMD 0603; Manufacturer: YAGEO; Manufacturer Part Number: CC0603ZRY5V9BB223; Temperature Rating: -20%~+80%; Package Size: 0603; JLCPCB Basic Part: No; JLCPCB Part Number: C113815; Supplier 1: LCSC; Category: Capacitors - MLCC; Supplier Part Number 1: C113815; Voltage Rating: 50V; Temperature Coefficient: Y5V; RoHS: Yes; ComponentLink1Description: Datasheet; ComponentLink1URL: https://wmsc.lcsc.com/wmsc/upload/file/pdf/v2/lcsc/2304140030_YAGEO-CC0603ZRY5V9BB223_C113815.pdf; ComponentLink2Description: JLCPCB Part URL; ComponentLink2URL: https://jlcpcb.com/partdetail/C113815; ComponentLink3Description: LCSC Part URL; ComponentLink3URL: https://lcsc.com/product-detail/Multilayer-Ceramic-Capacitors-MLCC---SMD-SMT_YAGEO-YAGEO-CC0603ZRY5V9BB223_C113815.html
footprint CAP-0603 (0603 (1608M) Capacitor)
pins: 1, 2

## CC0603ZRY5V9BB224
designator C?  Capacitance: 220nF  (hidden comment: *)
Capacitor, Ceramic (MLCC), 220nF, 50V, Y5V, SMD 0603; Manufacturer: YAGEO; Manufacturer Part Number: CC0603ZRY5V9BB224; Temperature Rating: -20%~+80%; Package Size: 0603; JLCPCB Basic Part: No; JLCPCB Part Number: C106855; Supplier 1: LCSC; Category: Capacitors - MLCC; Supplier Part Number 1: C106855; Voltage Rating: 50V; Temperature Coefficient: Y5V; RoHS: Yes; ComponentLink1Description: Datasheet; ComponentLink1URL: https://wmsc.lcsc.com/wmsc/upload/file/pdf/v2/lcsc/2304140030_YAGEO-CC0603ZRY5V9BB224_C106855.pdf; ComponentLink2Description: JLCPCB Part URL; ComponentLink2URL: https://jlcpcb.com/partdetail/C106855; ComponentLink3Description: LCSC Part URL; ComponentLink3URL: https://lcsc.com/product-detail/Multilayer-Ceramic-Capacitors-MLCC---SMD-SMT_YAGEO-YAGEO-CC0603ZRY5V9BB224_C106855.html
footprint CAP-0603 (0603 (1608M) Capacitor)
pins: 1, 2

## CC0603ZRY5V9BB333
designator C?  Capacitance: 33nF  (hidden comment: *)
Capacitor, Ceramic (MLCC), 33nF, 50V, Y5V, SMD 0603; Manufacturer: YAGEO; Manufacturer Part Number: CC0603ZRY5V9BB333; Temperature Rating: -20%~+80%; Package Size: 0603; JLCPCB Basic Part: No; JLCPCB Part Number: C576879; Supplier 1: LCSC; Category: Capacitors - MLCC; Supplier Part Number 1: C576879; Voltage Rating: 50V; Temperature Coefficient: Y5V; RoHS: Yes; ComponentLink1Description: Datasheet; ComponentLink1URL: https://wmsc.lcsc.com/wmsc/upload/file/pdf/v2/lcsc/2304140030_YAGEO-CC0603ZRY5V9BB333_C576879.pdf; ComponentLink2Description: JLCPCB Part URL; ComponentLink2URL: https://jlcpcb.com/partdetail/C576879; ComponentLink3Description: LCSC Part URL; ComponentLink3URL: https://lcsc.com/product-detail/Multilayer-Ceramic-Capacitors-MLCC---SMD-SMT_YAGEO-YAGEO-CC0603ZRY5V9BB333_C576879.html
footprint CAP-0603 (0603 (1608M) Capacitor)
pins: 1, 2

## CC0603ZRY5V9BB473
designator C?  Capacitance: 47nF  (hidden comment: *)
Capacitor, Ceramic (MLCC), 47nF, 50V, Y5V, SMD 0603; Manufacturer: YAGEO; Manufacturer Part Number: CC0603ZRY5V9BB473; Temperature Rating: -20%~+80%; Package Size: 0603; JLCPCB Basic Part: No; JLCPCB Part Number: C327289; Supplier 1: LCSC; Category: Capacitors - MLCC; Supplier Part Number 1: C327289; Voltage Rating: 50V; Temperature Coefficient: Y5V; RoHS: Yes; ComponentLink1Description: Datasheet; ComponentLink1URL: https://wmsc.lcsc.com/wmsc/upload/file/pdf/v2/lcsc/1811141225_YAGEO-CC0603ZRY5V9BB473_C327289.pdf; ComponentLink2Description: JLCPCB Part URL; ComponentLink2URL: https://jlcpcb.com/partdetail/C327289; ComponentLink3Description: LCSC Part URL; ComponentLink3URL: https://lcsc.com/product-detail/Multilayer-Ceramic-Capacitors-MLCC---SMD-SMT_YAGEO-YAGEO-CC0603ZRY5V9BB473_C327289.html
footprint CAP-0603 (0603 (1608M) Capacitor)
pins: 1, 2

## CEU3E2X7R1H103KT0Y0S
designator C?  Capacitance: 10nF  (hidden comment: *)
Capacitor, Ceramic (MLCC), 10nF, ±10%, 50V, X7R, ±10%, SMD 0603; Manufacturer: TDK; Manufacturer Part Number: CEU3E2X7R1H103KT0Y0S; Package Size: 0603; JLCPCB Basic Part: No; JLCPCB Part Number: C165826; Supplier 1: LCSC; Category: Capacitors - MLCC; Supplier Part Number 1: C165826; Tolerance: ±10%; Voltage Rating: 50V; Temperature Coefficient: X7R; RoHS: Yes; ComponentLink1Description: Datasheet; ComponentLink1URL: https://wmsc.lcsc.com/wmsc/upload/file/pdf/v2/lcsc/1811131641_TDK-CEU3E2X7R1H103KT0Y0S_C165826.pdf; ComponentLink2Description: JLCPCB Part URL; ComponentLink2URL: https://jlcpcb.com/partdetail/C165826; ComponentLink3Description: LCSC Part URL; ComponentLink3URL: https://lcsc.com/product-detail/Multilayer-Ceramic-Capacitors-MLCC---SMD-SMT_TDK-TDK-CEU3E2X7R1H103KT0Y0S_C165826.html
footprint CAP-0603 (0603 (1608M) Capacitor)
pins: 1, 2

## CEU3E2X7R1H333KT0Y0S
designator C?  Capacitance: 33nF  (hidden comment: *)
Capacitor, Ceramic (MLCC), 33nF, ±10%, 50V, X7R, ±10%, SMD 0603; Manufacturer: TDK; Manufacturer Part Number: CEU3E2X7R1H333KT0Y0S; Package Size: 0603; JLCPCB Basic Part: No; JLCPCB Part Number: C165825; Supplier 1: LCSC; Category: Capacitors - MLCC; Supplier Part Number 1: C165825; Tolerance: ±10%; Voltage Rating: 50V; Temperature Coefficient: X7R; RoHS: Yes; ComponentLink1Description: Datasheet; ComponentLink1URL: https://wmsc.lcsc.com/wmsc/upload/file/pdf/v2/lcsc/1811131649_TDK-CEU3E2X7R1H333KT0Y0S_C165825.pdf; ComponentLink2Description: JLCPCB Part URL; ComponentLink2URL: https://jlcpcb.com/partdetail/C165825; ComponentLink3Description: LCSC Part URL; ComponentLink3URL: https://lcsc.com/product-detail/Multilayer-Ceramic-Capacitors-MLCC---SMD-SMT_TDK-TDK-CEU3E2X7R1H333KT0Y0S_C165825.html
footprint CAP-0603 (0603 (1608M) Capacitor)
pins: 1, 2

## CEU3E2X7R1H472KT0Y0S
designator C?  Capacitance: 4.7nF  (hidden comment: *)
Capacitor, Ceramic (MLCC), 4.7nF, 50V, X7R, SMD 0603; Manufacturer: TDK; Manufacturer Part Number: CEU3E2X7R1H472KT0Y0S; Package Size: 0603; JLCPCB Basic Part: No; JLCPCB Part Number: C2991835; Supplier 1: LCSC; Category: Capacitors - MLCC; Supplier Part Number 1: C2991835; Voltage Rating: 50V; Temperature Coefficient: X7R; RoHS: Yes; ComponentLink1Description: Datasheet; ComponentLink1URL: https://wmsc.lcsc.com/wmsc/upload/file/pdf/v2/lcsc/2204151015_TDK-CEU3E2X7R1H472KT0Y0S_C2991835.pdf; ComponentLink2Description: JLCPCB Part URL; ComponentLink2URL: https://jlcpcb.com/partdetail/C2991835; ComponentLink3Description: LCSC Part URL; ComponentLink3URL: https://lcsc.com/product-detail/Multilayer-Ceramic-Capacitors-MLCC---SMD-SMT_TDK-TDK-CEU3E2X7R1H472KT0Y0S_C2991835.html
footprint CAP-0603 (0603 (1608M) Capacitor)
pins: 1, 2